# Altium footprint library MinervaBots.PcbLib: 162 footprints (part 9 of 11)
Each footprint in its own frame and in the unit in brackets; x right, y up, seen from the top. Pads: shape width x height; smd on the part's side, far side on the other; paste and mask are expansions set on the pad; w line width, h text height; cw(c..) or ccw(c..) is an arc to the next point about the centre after c.
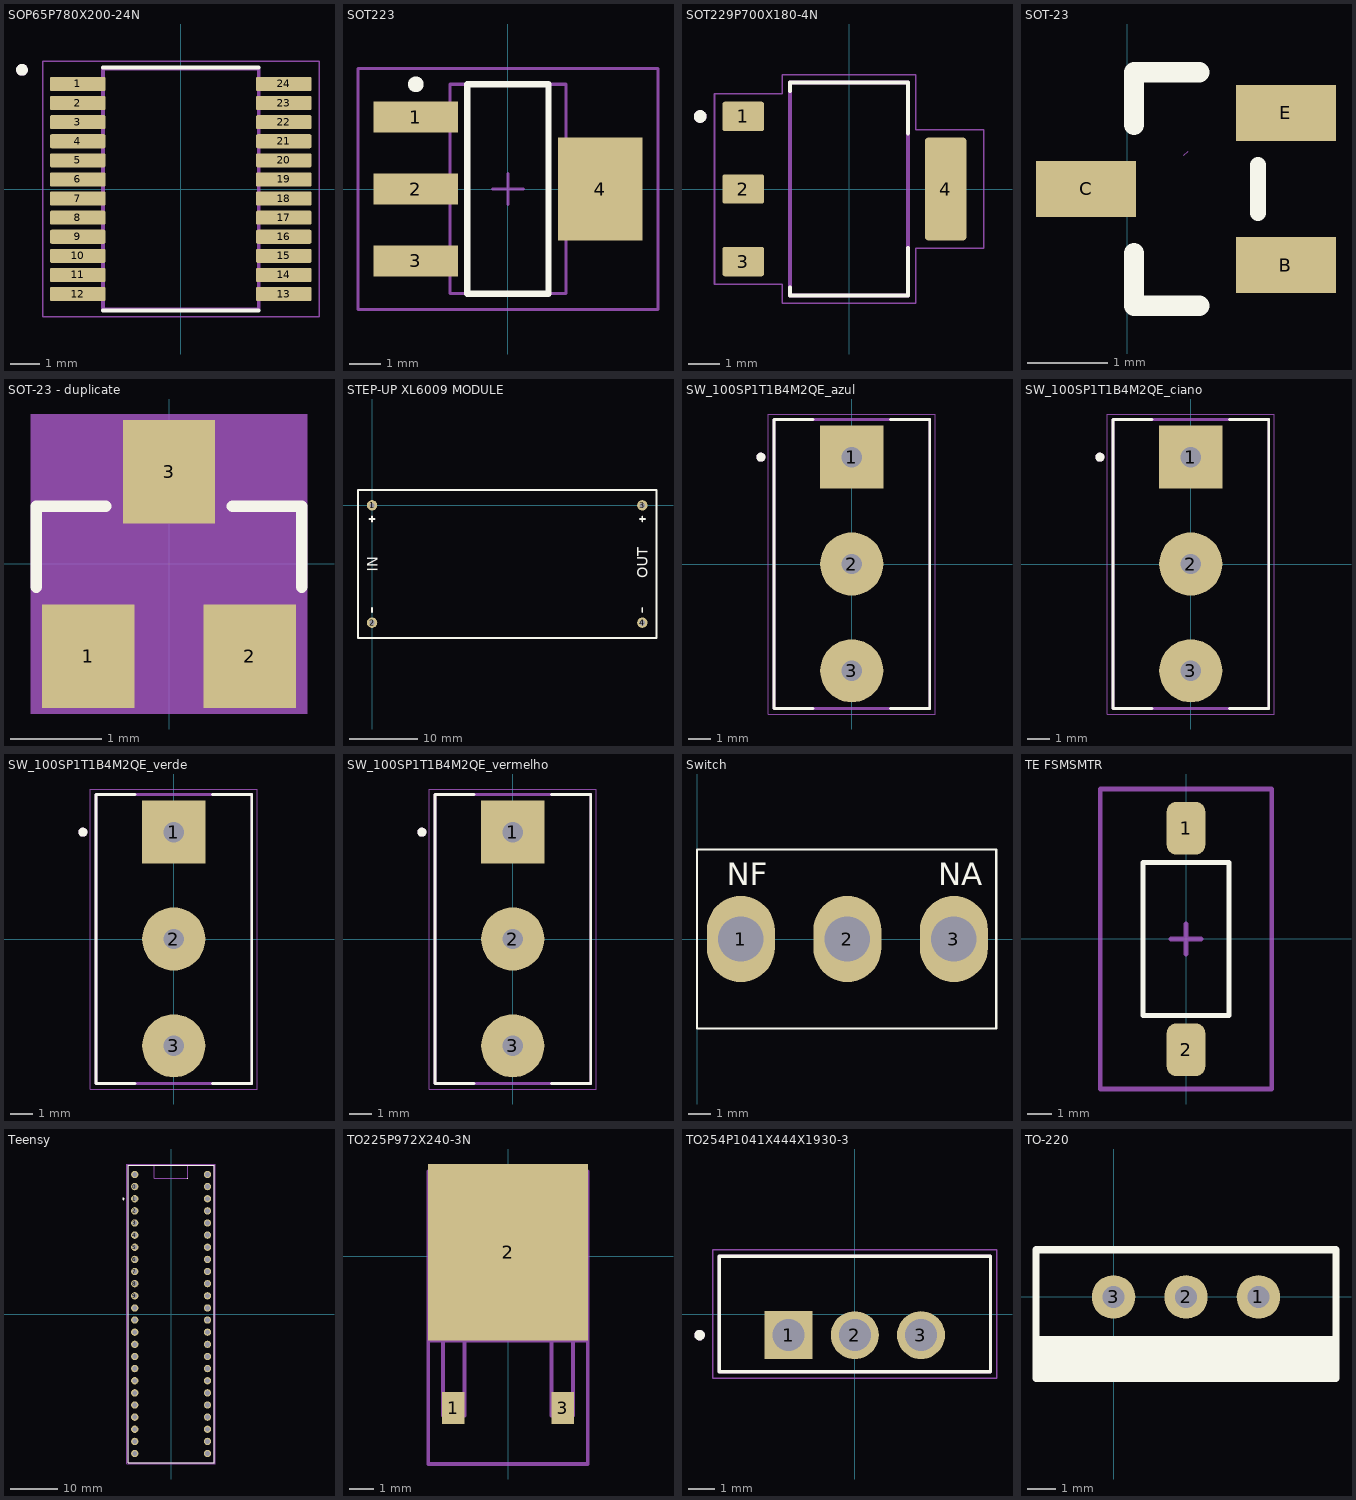
[diagram p8: the footprints below, top view; thin cyan lines are the x and y axes]

## SOP65P780X200-24N [mm]
pads (24):
  rrect25% 1.9x0.48 smd: 1(-3.505,3.575) 2(-3.505,2.925) 3(-3.505,2.275) 4(-3.505,1.625) 5(-3.505,0.975) 6(-3.505,0.325) 7(-3.505,-0.325) 8(-3.505,-0.975) 9(-3.505,-1.625) 10(-3.505,-2.275) 11(-3.505,-2.925) 12(-3.505,-3.575) 13(3.505,-3.575) 14(3.505,-2.925) 15(3.505,-2.275) 16(3.505,-1.625) 17(3.505,-0.975) 18(3.505,-0.325) 19(3.505,0.325) 20(3.505,0.975) 21(3.505,1.625) 22(3.505,2.275) 23(3.505,2.925) 24(3.505,3.575)
Top Overlay:
  circle w0.2: c-5.405,4.055 r0.1
  lines w0.127: -2.65,-4.135 2.65,-4.135 ; -2.65,4.135 2.65,4.135
Mechanical 13:
  circle w0.2: c-5.405,4.055 r0.1
  lines w0.127: -2.65,-4.1 -2.65,4.1 2.65,4.1 2.65,-4.1 -2.65,-4.1
Mechanical 15:
  lines w0.05: -4.705,-4.35 -4.705,4.35 4.705,4.35 4.705,-4.35 -4.705,-4.35
3D body "CD74HC4067SM96E4.STEP": height 2, standoff 0, extent -3.675,-4.1 4.125,4.1

## SOT223 [mm] "SOT223, 4-Leads, Body 6.5x3.5mm, Pitch 2.3mm, Lead Span 7mm, IPC Low Density"
height 1.8
pads (4):
  rect 2.7x1 smd: 1(-2.95,2.3) 2(-2.95,0) 3(-2.95,-2.3)
  rect 2.7x3.3 smd: 4(2.95,0)
Top Overlay:
  circle w0.25: c-2.95,3.35 r0.125
  lines w0.2: -1.3,-3.35 -1.3,3.35 1.3,3.35 1.3,-3.35 -1.3,-3.35
Top Designator:
  text ".Designator" at -7.618,-0.508 h1.52
Mechanical 13:
  lines w0.1: -1.85,-3.35 -1.85,3.35 1.85,3.35 1.85,-3.35 -1.85,-3.35
Mechanical 15:
  lines w0.1: -0.5,0 0.5,0 ; 0,-0.5 0,0.5 ; -4.8,-3.85 -4.8,3.85 4.8,3.85 4.8,-3.85 -4.8,-3.85
3D body "SOT223-3.step": height 1.6, standoff 0, extent -3.664,-3.302 3.41,3.198

## SOT229P700X180-4N [mm]
pads (4):
  rrect15% 1.31x0.93 smd: 1(-3.345,2.29) 2(-3.345,0) 3(-3.345,-2.29)
  rrect15% 1.31x3.24 smd: 4(3.049,0)
Top Overlay:
  circle w0.2: c-4.703,2.29 r0.1
  lines w0.127: -1.86,-3.11 -1.86,-3.36 1.86,-3.36 1.86,-1.87 ; -1.86,3.1 -1.86,3.36 1.86,3.36 1.86,1.76
Top Designator:
  text ".Designator" at -7.932,-0.508 h1.52
Mechanical 13:
  circle w0.2: c-4.703,2.29 r0.1
  lines w0.127: -1.86,-3.36 -1.86,3.36 1.86,3.36 1.86,-3.36 -1.86,-3.36
Mechanical 15:
  lines w0.05: -4.25,-3.01 -2.11,-3.01 -2.11,-3.61 2.11,-3.61 2.11,-1.87 4.25,-1.87 4.25,1.87 2.11,1.87 2.11,3.61 -2.11,3.61 -2.11,3.01 -4.25,3.01 -4.25,-3.01
3D body "AMS1117.STEP": height 1.77, standoff -0.04, extent -3.624,-3.251 3.374,3.251

## SOT-23 [mm]
pads (3):
  rect 1.25x0.7 smd: B(1.981,-12.546) C(-0.518,-11.596) E(1.981,-10.646)
Top Overlay:
  lines w0.2: 1.632,-11.896 1.632,-11.296
  lines w0.254: 0.082,-12.396 0.082,-13.056 0.897,-13.056 ; 0.897,-10.136 0.082,-10.136 ; 0.082,-10.796 0.082,-10.136 ; 0.082,-10.796 0.082,-10.136 ; 0.082,-10.796 0.082,-10.136
Top Designator:
  text ".Designator" at -6.886,-12.103 h1.52
Mechanical 15:
  lines w0.003: 0.706,-11.176 0.757,-11.125
3D body "CircuitWorks-SOT-23.step": height 1.05, standoff -0.05, extent -0.259,-13.108 2.241,-10.108

## SOT-23 - duplicate [mil]
pads (3):
  rect 40x45 smd: 1(-35,-40) 2(35,-40) 3(0,40)
Top Overlay:
  lines w5: -57.5,-10 -57.5,25 -27.5,25 ; 27.5,25 57.5,25 57.5,-10
Top Designator:
  text ".Designator" at -299.93,-19.99 h60
Mechanical 13:
  region: -28,-51 -46,-51 -46,-28 -28,-28
  region: 46,-51.01 28.01,-51.01 28.01,-28 46,-28
  region: 9,28 -9,28 -9,51 9,51
Mechanical 15:
  region: 60,-65.06 -60.06,-65.06 -60.06,65 60,65

## STEP-UP XL6009 MODULE [mil]
pads (4):
  round 60 hole 30: 1(0,0) 2(0,-675) 3(1555,0) 4(1555,-675)
Top Overlay:
  lines w10: -14.76,-78.74 14.76,-78.74 ; 0,-615.16 0,-590.55 ; 0,-93.5 0,-63.98 ; 1540.35,-78.74 1569.88,-78.74 ; 1555,-615.16 1555,-590.67 ; 1555,-93.5 1555,-63.98 ; -80.91,-762.99 -80.91,88.39 1636.61,88.39 1636.61,-762.99 -80.91,-762.99
  text "OUT" at 1585.28,-418.35 h60
  text "IN" at 32.13,-380.94 h60
Top Designator:
  text ".Designator" at 477.95,-357.3 h60
3D body "PLS-1.step": height 551.18, standoff 94.49, extent 1505,-725 1605,-625
3D body "PLS-1.step": height 551.18, standoff 94.49, extent 1505,-50 1605,50
3D body "PLS-1.step": height 551.18, standoff 94.49, extent -50.01,-725 49.99,-625
3D body "PLS-1.step": height 551.18, standoff 94.49, extent -50,-50 50,50
3D body "PBS-1.step": height 334.65, standoff -118.11, extent 1505,-725 1605,-625
3D body "PBS-1.step": height 334.65, standoff -118.11, extent 1505,-50 1605,50
3D body "PBS-1.step": height 334.65, standoff -118.11, extent -50.01,-725 49.99,-625
3D body "PBS-1.step": height 334.65, standoff -118.11, extent -50.01,-50 49.99,50
3D body "XL6009.stp": height 935, standoff 228, extent -72.5,-752.5 1627.5,77.5

## SW_100SP1T1B4M2QE_azul [mm]
pads (3):
  rect 2.775x2.775 hole 0.9: 1(0,4.7)
  round 2.775 hole 0.9: 2(0,0) 3(0,-4.7)
Top Overlay:
  circle w0.2: c-4,4.7 r0.1
  lines w0.127: -1.71,-6.35 -3.43,-6.35 -3.43,6.35 -1.71,6.35 ; 1.71,-6.35 3.43,-6.35 3.43,6.35 1.71,6.35
Top Designator:
  text ".Designator" at -7.865,-0.508 h1.52
Mechanical 13:
  circle w0.2: c-4,4.7 r0.1
  lines w0.127: -3.43,-6.35 3.43,-6.35 3.43,6.35 -3.43,6.35 -3.43,-6.35
Mechanical 15:
  lines w0.05: -3.68,-6.6 3.68,-6.6 3.68,6.6 -3.68,6.6 -3.68,-6.6
3D body "SwitchAzul.step": height 29.68, standoff -5.1, extent -3.43,-6.35 3.43,6.35

## SW_100SP1T1B4M2QE_ciano [mm]
pads (3):
  rect 2.775x2.775 hole 0.9: 1(0,4.7)
  round 2.775 hole 0.9: 2(0,0) 3(0,-4.7)
Top Overlay:
  circle w0.2: c-4,4.7 r0.1
  lines w0.127: -1.71,-6.35 -3.43,-6.35 -3.43,6.35 -1.71,6.35 ; 1.71,-6.35 3.43,-6.35 3.43,6.35 1.71,6.35
Top Designator:
  text ".Designator" at -7.865,-0.508 h1.52
Mechanical 13:
  circle w0.2: c-4,4.7 r0.1
  lines w0.127: -3.43,-6.35 -3.43,6.35 3.43,6.35 3.43,-6.35 -3.43,-6.35
Mechanical 15:
  lines w0.05: -3.68,-6.6 -3.68,6.6 3.68,6.6 3.68,-6.6 -3.68,-6.6
3D body "SwitchCiano.step": height 29.68, standoff -5.1, extent -3.43,-6.35 3.43,6.35

## SW_100SP1T1B4M2QE_verde [mm]
pads (3):
  rect 2.775x2.775 hole 0.9: 1(0,4.7)
  round 2.775 hole 0.9: 2(0,0) 3(0,-4.7)
Top Overlay:
  circle w0.2: c-4,4.7 r0.1
  lines w0.127: -1.71,-6.35 -3.43,-6.35 -3.43,6.35 -1.71,6.35 ; 1.71,-6.35 3.43,-6.35 3.43,6.35 1.71,6.35
Top Designator:
  text ".Designator" at -7.865,-0.508 h1.52
Mechanical 13:
  circle w0.2: c-4,4.7 r0.1
  lines w0.127: -3.43,-6.35 -3.43,6.35 3.43,6.35 3.43,-6.35 -3.43,-6.35
Mechanical 15:
  lines w0.05: -3.68,-6.6 -3.68,6.6 3.68,6.6 3.68,-6.6 -3.68,-6.6
3D body "SwitchVerde.step": height 29.68, standoff -5.1, extent -3.43,-6.35 3.43,6.35

## SW_100SP1T1B4M2QE_vermelho [mm]
pads (3):
  rect 2.775x2.775 hole 0.9: 1(0,4.7)
  round 2.775 hole 0.9: 2(0,0) 3(0,-4.7)
Top Overlay:
  circle w0.2: c-4,4.7 r0.1
  lines w0.127: -1.71,-6.35 -3.43,-6.35 -3.43,6.35 -1.71,6.35 ; 1.71,-6.35 3.43,-6.35 3.43,6.35 1.71,6.35
Top Designator:
  text ".Designator" at -7.865,-0.508 h1.52
Mechanical 13:
  circle w0.2: c-4,4.7 r0.1
  lines w0.127: -3.43,-6.35 -3.43,6.35 3.43,6.35 3.43,-6.35 -3.43,-6.35
Mechanical 15:
  lines w0.05: -3.68,-6.6 -3.68,6.6 3.68,6.6 3.68,-6.6 -3.68,-6.6
3D body "SwitchVermelho.step": height 29.68, standoff -5.1, extent -3.43,-6.35 3.43,6.35

## Switch [mm] "Switch biestable 3 pins"
pads (3):
  oval 3x3.8 hole 2: 1(1.93,0) 2(6.63,0) 3(11.33,0)
Top Overlay:
  lines w0.1: 0,-3.95 13.2,-3.95 13.2,3.95 0,3.95 0,-3.95
  text "NA" at 10.643,2.362 h1
  text "NF" at 1.321,2.362 h1
Top Designator:
  text ".Designator" at -1.018,-0.508 h1.52
3D body "Toggle Switch Daily Well 1AS1T2B4M2QE.STEP": height 23.51, standoff -5.7, extent 0.204,-3.224 12.904,3.376

## TE FSMSMTR [mm]
pads (2):
  rrect50% 1.6x2.19 smd: 1(0,4.595) 2(0,-4.595)
Top Overlay:
  lines w0.2: -1.778,-3.175 -1.778,3.175 1.778,3.175 1.778,-3.175 -1.778,-3.175
Top Designator:
  text ".Designator" at -7.618,-0.508 h1.52
Mechanical 15:
  lines w0.2: -0.635,0 0.635,0 ; 0,-0.635 0,0.635 ; -3.556,-6.223 3.556,-6.223 3.556,6.223 -3.556,6.223 -3.556,-6.223
3D body "FSMSMTR.STEP": height 4.42, standoff 0, extent -1.75,-4.984 1.75,4.985

## Teensy [mm]
pads (48):
  round 1.53 hole 1.02: 0(-7.62,26.67) 1(-7.62,24.13) 2(-7.62,21.59) 3(-7.62,19.05) 3V3_1(-7.62,-6.35) 3V3_2(7.62,24.13) 4(-7.62,16.51) 5(-7.62,13.97) 6(-7.62,11.43) 7(-7.62,8.89) 8(-7.62,6.35) 9(-7.62,3.81) 10(-7.62,1.27) 11(-7.62,-1.27) 12(-7.62,-3.81) 13(7.62,-3.81) 14(7.62,-1.27) 15(7.62,1.27) 16(7.62,3.81) 17(7.62,6.35) 18(7.62,8.89) 19(7.62,11.43) 20(7.62,13.97) 21(7.62,16.51) 22(7.62,19.05) 23(7.62,21.59) 24(-7.62,-8.89) 25(-7.62,-11.43) 26(-7.62,-13.97) 27(-7.62,-16.51) 28(-7.62,-19.05) 29(-7.62,-21.59) 30(-7.62,-24.13) 31(-7.62,-26.67) 32(-7.62,-29.21) 33(7.62,-29.21) 34(7.62,-26.67) 35(7.62,-24.13) 36(7.62,-21.59) 37(7.62,-19.05) 38(7.62,-16.51) 39(7.62,-13.97) A21(7.62,-11.43) A22(7.62,-8.89) AGND(7.62,26.67) GND_1(-7.62,29.21) GND_2(7.62,-6.35) VIN(7.62,29.21)
Top Overlay:
  circle w0.152: c-10,24.1 r0.141
  lines w0.127: -9,-31.15 9,-31.15 9,31.15 -9,31.15 -9,-31.15
  lines w0.152: 3.4,28.4 3.5,28.4
Mechanical 1:
  lines w0.127: -9,-31.15 9,-31.15 9,31.15 -9,31.15 -9,-31.15
  lines w0.152: -3.5,31.1 -3.5,28.4 3.4,28.4 ; 3.5,28.4 3.5,31.1
Top Designator:
  text ".Designator" at -8.089,-0.313 h1.52
Mechanical 4:
  lines w0.05: -9.25,-31.4 -9.25,31.4 9.25,31.4 9.25,-31.4 -9.25,-31.4
3D body "female_header_a-bl254-eg-g24d.stp": height 8.5, standoff -3.2, extent -8.85,-30.607 -6.35,30.603
3D body "female_header_a-bl254-eg-g24d.stp": height 8.5, standoff -3.2, extent 6.37,-30.607 8.87,30.603
3D body "Teensy 3.5 - 3.6.step": height 15.49, standoff 2.35, extent -9.017,-30.545 8.763,31.815

## TO225P972X240-3N [mil]
pads (3):
  rect 37x52 smd: 1(-89,-248) 3(89,-248)
  rect 260x288 smd: 2(0,6)
Mechanical 1:
  lines w6: -130,-138 -130,-339 130,-339 130,-138 ; -130,-138 130,-138 ; -130,-138 -130,138 130,138 130,-138 ; -106,-260 -106,-138 -71,-138 -71,-260 -106,-260 ; 71,-260 71,-138 106,-138 106,-260 71,-260
Top Designator:
  text ".Designator" at -299.9,-113.99 h60
3D body "TO252.STEP": height 90.39, standoff -4.09, extent -127.95,-248.27 127.96,110

## TO254P1041X444X1930-3 [mm]
pads (3):
  rect 1.845x1.845 hole 1.23: 1(-2.54,-0.81)
  round 1.845 hole 1.23: 2(0,-0.81) 3(2.54,-0.81)
Top Overlay:
  circle w0.2: c-5.957,-0.81 r0.1
  lines w0.127: -5.208,-2.222 -5.208,2.222 5.208,2.222 5.208,-2.222 -5.208,-2.222
Top Designator:
  text ".Designator" at -7.955,-0.508 h1.52
Mechanical 13:
  circle w0.2: c-5.957,-0.81 r0.1
  lines w0.127: -5.208,-2.222 -5.208,2.222 5.208,2.222 5.208,-2.222 -5.208,-2.222
Mechanical 15:
  lines w0.05: -5.457,-2.472 -5.457,2.472 5.457,2.472 5.457,-2.472 -5.457,-2.472
3D body "step_temp.STEP": height 19.3, standoff -10.03, extent -5.207,-2.222 5.207,2.222

## TO-220 [mil] "TO-220 coupling"
pads (3):
  round 60 hole 30: 1(200,0) 2(100,0) 3(0,0)
Top Overlay:
  rectangle: -107,-112 306.97,-54
  lines w10: -107,-112 307,-112 307,65 -106.97,65 -107,-112
Top Designator:
  text ".Designator" at -199.9,-43.49 h60
3D body "TO-220.STEP": height 810.24, standoff -331.5, extent -106.97,-112.16 306.97,65